# Altium footprint library mastermind.PCBLIB: 1061 footprints (part 40 of 67)
Each footprint in its own frame and in the unit in brackets; x right, y up, seen from the top. Pads: shape width x height; smd on the part's side, far side on the other; paste and mask are expansions set on the pad; w line width, h text height; cw(c..) or ccw(c..) is an arc to the next point about the centre after c.
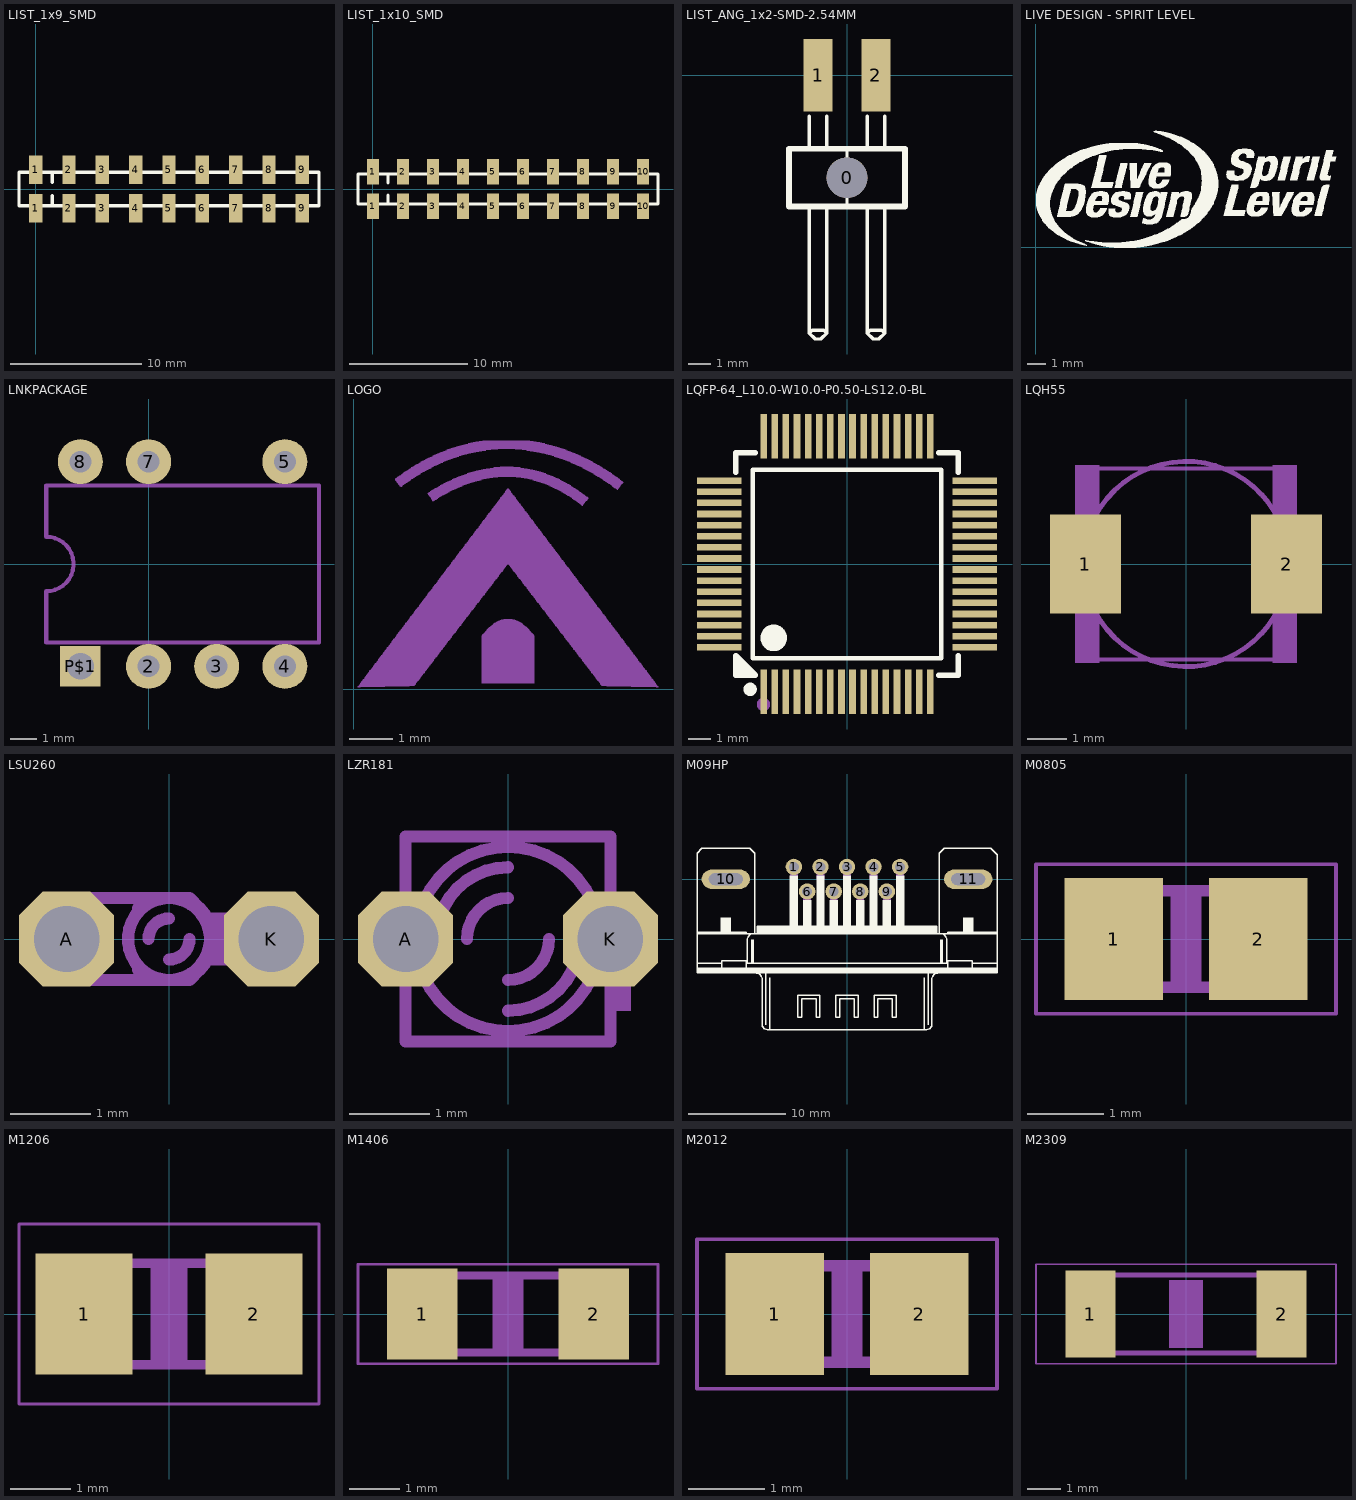
[diagram p39: the footprints below, top view; thin cyan lines are the x and y axes]

## LIST_1x9_SMD [mm]
pads (18):
  rect 1.02x2.19 smd: 1(0,-1.465) 1(0,1.465) 2(2.54,-1.465) 2(2.54,1.465) 3(5.08,-1.465) 3(5.08,1.465) 4(7.62,-1.465) 4(7.62,1.465) 5(10.16,-1.465) 5(10.16,1.465) 6(12.7,-1.465) 6(12.7,1.465) 7(15.24,-1.465) 7(15.24,1.465) 8(17.78,-1.465) 8(17.78,1.465) 9(20.32,-1.465) 9(20.32,1.465)
Top Overlay:
  lines w0.254: 1.27,-1.27 1.27,-0.508 ; 1.27,0.508 1.27,1.27 ; -1.27,-1.27 21.59,-1.27 21.59,1.27 -1.27,1.27 -1.27,-1.27

## LIST_1x10_SMD [mm]
pads (20):
  rect 1.02x2.19 smd: 1(0,-1.465) 1(0,1.465) 2(2.54,-1.465) 2(2.54,1.465) 3(5.08,-1.465) 3(5.08,1.465) 4(7.62,-1.465) 4(7.62,1.465) 5(10.16,-1.465) 5(10.16,1.465) 6(12.7,-1.465) 6(12.7,1.465) 7(15.24,-1.465) 7(15.24,1.465) 8(17.78,-1.465) 8(17.78,1.465) 9(20.32,-1.465) 9(20.32,1.465) 10(22.86,-1.465) 10(22.86,1.465)
Top Overlay:
  lines w0.254: 1.27,-1.27 1.27,-0.508 ; 1.27,0.508 1.27,1.27 ; -1.27,-1.27 24.13,-1.27 24.13,1.27 -1.27,1.27 -1.27,-1.27

## LIST_ANG_1x2-SMD-2.54MM [mm]
pads (3):
  round 1.78 hole 1.78: 0(0,-4.496)
  rect 1.27x3.18 smd: 1(-1.27,0) 2(1.27,0)
Top Overlay:
  lines w0.15: -1.651,-5.766 -1.651,-11.324 ; -1.651,-3.226 -1.651,-1.8 ; -0.889,-5.766 -0.889,-11.324 ; -0.889,-3.226 -0.889,-1.8 ; 0,-5.766 0,-3.226 ; 0.889,-5.766 0.889,-11.324 ; 0.889,-3.226 0.889,-1.8 ; 1.651,-5.766 1.651,-11.324 ; 1.651,-3.226 1.651,-1.8 ; -1.651,-11.324 -1.397,-11.578 -1.143,-11.578 -0.889,-11.324 ; -1.651,-11.324 -1.524,-11.197 -1.016,-11.197 -0.889,-11.324 ; 0.889,-11.324 1.143,-11.578 1.397,-11.578 1.651,-11.324 ; 0.889,-11.324 1.016,-11.197 1.524,-11.197 1.651,-11.324
  lines w0.254: -2.54,-5.766 -2.54,-3.226 2.54,-3.226 2.54,-5.766 -2.54,-5.766
3D body "Samtec-TSM-102-01-L-SH-A.step": height 3.03, standoff -1.41, extent -2.56,-11.605 2.52,1.349

## LIVE DESIGN - SPIRIT LEVEL [mm]
Top Overlay:
  drawing of 2120 lines, arcs and shapes, not listed

## LNKPACKAGE [mil]
pads (7):
  round 66 hole 32: 2(0,-150) 3(100,-150) 4(200,-150) 5(200,150) 7(0,150) 8(-100,150)
  rect 59.05x59.05 hole 39.37: P$1(-100,-150)
Mechanical 2:
  lines w6: -150,-115 250,-115 250,115 -150,115 -150,40 cw(c-150,0) -150,-40 -150,-115

## LOGO [mm]
Mechanical 2:
  drawing of 983 lines, arcs and shapes, not listed

## LQFP-64_L10.0-W10.0-P0.50-LS12.0-BL [mm]
pads (64):
  rect 0.3x2 smd paste+0 mask+0.051: 1(-3.75,-5.75) 2(-3.25,-5.75) 3(-2.75,-5.75) 4(-2.25,-5.75) 5(-1.75,-5.75) 6(-1.25,-5.75) 7(-0.75,-5.75) 8(-0.25,-5.75) 9(0.25,-5.75) 10(0.75,-5.75) 11(1.25,-5.75) 12(1.75,-5.75) 13(2.25,-5.75) 14(2.75,-5.75) 15(3.25,-5.75) 16(3.75,-5.75) 33(3.75,5.75) 34(3.25,5.75) 35(2.75,5.75) 36(2.25,5.75) 37(1.75,5.75) 38(1.25,5.75) 39(0.75,5.75) 40(0.25,5.75) 41(-0.25,5.75) 42(-0.75,5.75) 43(-1.25,5.75) 44(-1.75,5.75) 45(-2.25,5.75) 46(-2.75,5.75) 47(-3.25,5.75) 48(-3.75,5.75)
  rect 2x0.3 smd paste+0 mask+0.051: 17(5.75,-3.75) 18(5.75,-3.25) 19(5.75,-2.75) 20(5.75,-2.25) 21(5.75,-1.75) 22(5.75,-1.25) 23(5.75,-0.75) 24(5.75,-0.25) 25(5.75,0.25) 26(5.75,0.75) 27(5.75,1.25) 28(5.75,1.75) 29(5.75,2.25) 30(5.75,2.75) 31(5.75,3.25) 32(5.75,3.75) 49(-5.75,3.75) 50(-5.75,3.25) 51(-5.75,2.75) 52(-5.75,2.25) 53(-5.75,1.75) 54(-5.75,1.25) 55(-5.75,0.75) 56(-5.75,0.25) 57(-5.75,-0.25) 58(-5.75,-0.75) 59(-5.75,-1.25) 60(-5.75,-1.75) 61(-5.75,-2.25) 62(-5.75,-2.75) 63(-5.75,-3.25) 64(-5.75,-3.75)
Top Overlay:
  region: -4.131,-5 -5,-4.131 -5,-5
  lines w0.2: -4.25,-4.25 -4.25,4.25 4.25,4.25 4.25,-4.25 -4.25,-4.25
  lines w0.254: -5,4.131 -5,5 -4.131,5 ; 4.131,-5 5,-5 5,-4.131 ; 4.131,5 5,5 5,4.131 ; -5,-4.131 -5,-4.131 ; -5,-4.131 -4.131,-5 -5,-5 -5,-4.131
  lines w0.3: -4.361,-5.49 ccw(c-4.36,-5.64) -4.359,-5.49
  lines w0.6: -3.299,-3.025 ccw(c-3.297,-3.325) -3.294,-3.025
Mechanical 15:
  circle w0.3: c-3.76,-6.32 r0.15
3D body "LQFP64 v1.step": height 1.6, standoff 0.02, extent -6.093,-6.085 6.045,6.053

## LQH55 [mm]
pads (2):
  rect 1.8x2.5 smd: 1(-2.55,0) 2(2.55,0)
Mechanical 2:
  circle w0.127: c0,0 r2.6
Mechanical 8:
  region: -2.8,-2.5 -2.8,2.5 -2.2,2.5 -2.2,-2.5
  region: 2.2,-2.5 2.2,2.5 2.8,2.5 2.8,-2.5
  lines w0.102: -2.725,-2.425 2.725,-2.425 ; -2.725,2.425 2.725,2.425

## LSU260 [mil]
pads (2):
  oct 46.48x46.48 hole 32: A(-50,0) K(50,0)
Mechanical 2:
  lines w6: -15,-15 -10,-20 10,-20 15,-15 ccw(c0,0) 15,15 10,20 -10,20 -15,15 ; -10,0 cw(c0,0) 0,10 ; 0,-10 ccw(c0,0) 10,0
Mechanical 8:
  circle w6: c0,0 r20
  region: 20,-10 20,10 55,10 55,-10
  region: -55,-10 -55,10 -45,10 -45,-10
  lines w6: 0,-20 -45,-20 -45,-10 ; 0,20 -45,20 -45,10 ; 20,-10 55,-10 55,10 20,10 ; -45,-10 -45,10 ; -45,-10 -55,-10 -55,10 -45,10

## LZR181 [mil]
pads (2):
  oct 46.48x46.48 hole 32: A(-50,0) K(50,0)
Mechanical 2:
  lines w6: -50,-35 -50,-50 50,-50 50,-35 ; -50,35 -50,50 50,50 50,35 ; -34.17,-29.29 ccw(c-0.01,0) 0,-45 ccw(c0.01,0) 34.17,-29.29 ; -34.17,29.29 cw(c-0.01,0) 0,45 cw(c0.01,0) 34.17,29.29 ; 0,-20 ccw(c0,0) 20,0
Mechanical 8:
  region: -60,-10 -60,10 -50,10 -50,-10
  region: 50,-35 50,10 60,10 60,-35
  lines w6: -50,-35 -50,35 ; -35,0 cw(c0,0) 0,35 ; -34.17,-29.29 cw(c0,-0.01) -45,0 cw(c0,0.01) -34.17,29.29 ; -20,0 cw(c0,0) 0,20 ; 0,-35 ccw(c0,0) 35,0 ; 34.17,-29.29 ccw(c0,-0.01) 45,0 ccw(c0,0.01) 34.17,29.29 ; 50,-35 50,35

## M09HP [mm]
pads (11):
  round 1.7 hole 1.016: 1(-5.486,1.27) 2(-2.743,1.27) 3(0,1.27) 4(2.743,1.27) 5(5.486,1.27) 6(-4.115,-1.27) 7(-1.372,-1.27) 8(1.372,-1.27) 9(4.115,-1.27)
  oval 5x2 hole 1.2 slot 3.5 at 0 deg: 10(-12.522,0) 11(12.522,0)
Top Overlay:
  drawing of 111 lines, arcs and shapes, not listed
Mechanical 3:
  lines w0.813: -5.486,0.127 -5.486,1.143 ; -4.115,-2.413 -4.115,-1.397 ; -2.743,0.127 -2.743,1.143 ; -1.372,-2.413 -1.372,-1.397 ; 0,0.127 0,1.143 ; 1.372,-2.413 1.372,-1.397 ; 2.743,0.127 2.743,1.143 ; 4.115,-2.413 4.115,-1.397 ; 5.486,0.127 5.486,1.143
3D body "DB9S-RA-PC1.STEP": height 12.77, standoff -3.57, extent -15.396,-15.709 15.414,2.59

## M0805 [mm]
pads (2):
  rect 1.3x1.6 smd: 1(-0.95,0) 2(0.95,0)
Mechanical 8:
  region: 0.686,-0.711 0.686,0.711 1.041,0.711 1.041,-0.711
  region: -1.041,-0.711 -1.041,0.711 -0.686,0.711 -0.686,-0.711
  lines w0.152: -0.711,-0.635 0.711,-0.635 ; -0.711,0.635 0.711,0.635
Mechanical 30:
  region: -0.2,-0.6 -0.2,0.6 0.2,0.6 0.2,-0.6
Mechanical 29 (Mech34):
  lines w0.051: -1.973,-0.983 -1.973,0.983 1.973,0.983 1.973,-0.983 -1.973,-0.983

## M1206 [mm]
pads (2):
  rect 1.6x2 smd: 1(-1.4,0) 2(1.4,0)
Mechanical 8:
  region: 1.118,-0.914 1.118,0.914 1.702,0.914 1.702,-0.914
  region: -1.702,-0.914 -1.702,0.914 -1.118,0.914 -1.118,-0.914
  lines w0.152: -1.143,-0.838 1.143,-0.838 ; -1.143,0.838 1.143,0.838
Mechanical 30:
  region: -0.3,-0.8 -0.3,0.8 0.3,0.8 0.3,-0.8
Mechanical 29 (Mech34):
  lines w0.051: -2.473,-1.483 -2.473,1.483 2.473,1.483 2.473,-1.483 -2.473,-1.483

## M1406 [mm]
pads (2):
  rect 1.4x1.8 smd: 1(-1.7,0) 2(1.7,0)
Mechanical 2:
  lines w0.152: -0.686,-0.762 0.686,-0.762 ; -0.686,0.762 0.686,0.762
Mechanical 8:
  region: 1.295,-0.838 1.295,0.838 1.854,0.838 1.854,-0.838
  region: -1.854,-0.838 -1.854,0.838 -1.295,0.838 -1.295,-0.838
  lines w0.152: -1.321,-0.762 1.321,-0.762 ; -1.321,0.762 1.321,0.762
Mechanical 30:
  region: -0.3,-0.7 -0.3,0.7 0.3,0.7 0.3,-0.7
Mechanical 29 (Mech34):
  lines w0.051: -2.973,-0.983 -2.973,0.983 2.973,0.983 2.973,-0.983 -2.973,-0.983

## M2012 [mm]
pads (2):
  rect 1.3x1.6 smd: 1(-0.95,0) 2(0.95,0)
Mechanical 8:
  region: 0.686,-0.711 0.686,0.711 1.041,0.711 1.041,-0.711
  region: -1.041,-0.711 -1.041,0.711 -0.686,0.711 -0.686,-0.711
  lines w0.152: -0.711,-0.635 0.711,-0.635 ; -0.711,0.635 0.711,0.635
Mechanical 30:
  region: -0.2,-0.6 -0.2,0.6 0.2,0.6 0.2,-0.6
Mechanical 29 (Mech34):
  lines w0.051: -1.973,-0.983 -1.973,0.983 1.973,0.983 1.973,-0.983 -1.973,-0.983

## M2309 [mm]
pads (2):
  rect 1.5x2.6 smd: 1(-2.85,0) 2(2.85,0)
Mechanical 2:
  lines w0.152: -1.676,1.168 1.651,1.168 ; -1.651,-1.168 1.651,-1.168
Mechanical 8:
  region: 2.388,-1.245 2.388,1.245 3.048,1.245 3.048,-1.245
  region: -3.048,-1.245 -3.048,1.245 -2.388,1.245 -2.388,-1.245
  lines w0.152: -2.438,1.168 2.413,1.168 ; -2.413,-1.168 2.413,-1.168
Mechanical 30:
  region: -0.5,-1 -0.5,1 0.5,1 0.5,-1
Mechanical 29 (Mech34):
  lines w0.051: -4.473,-1.483 -4.473,1.483 4.473,1.483 4.473,-1.483 -4.473,-1.483